# Altium footprint library 电阻封装库.PcbLib: 218 footprints (part 1 of 14)
Each footprint in its own frame and in the unit in brackets; x right, y up, seen from the top. Pads: shape width x height; smd on the part's side, far side on the other; paste and mask are expansions set on the pad; w line width, h text height; cw(c..) or ccw(c..) is an arc to the next point about the centre after c.
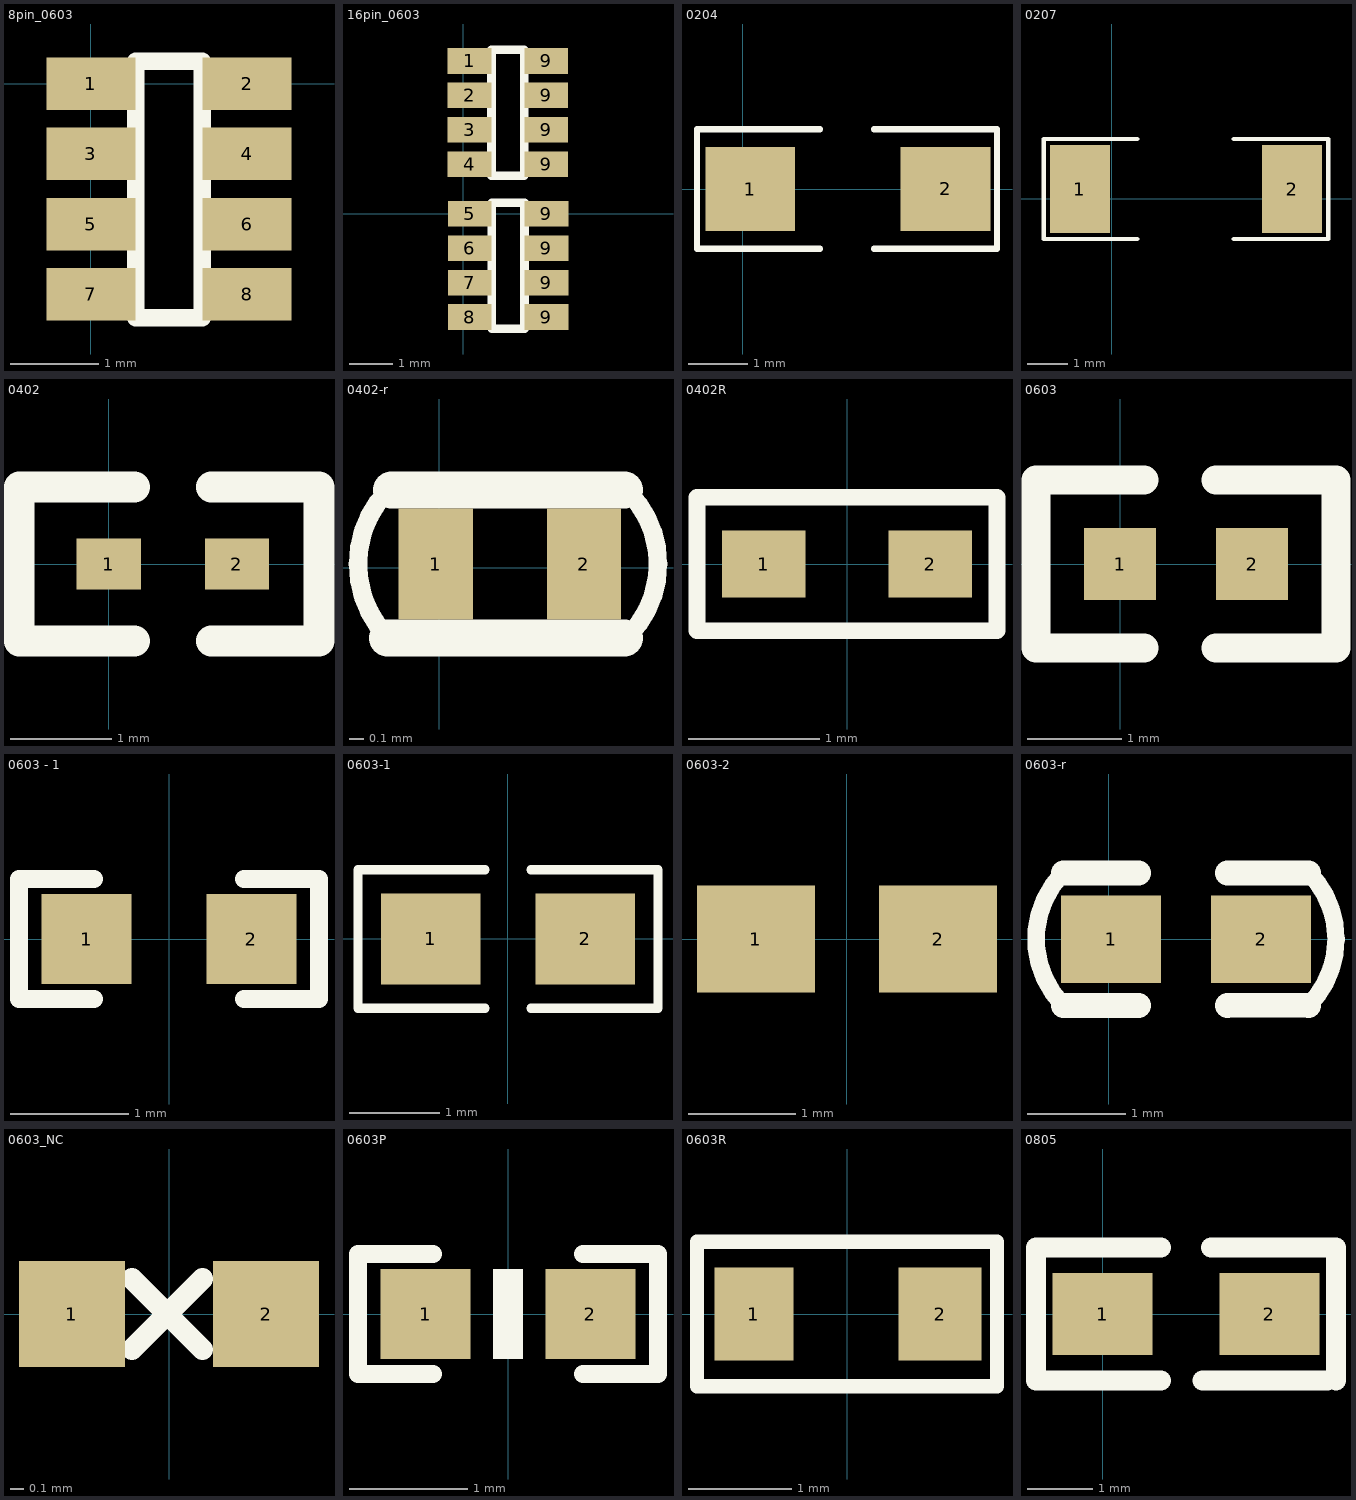
[diagram p0: the footprints below, top view; thin cyan lines are the x and y axes]

## 8pin_0603 [mm]
pads (8):
  rect 1.016x0.6 smd: 1(0,0) 2(1.778,0) 3(0,-0.8) 4(1.778,-0.8) 5(0,-1.6) 6(1.778,-1.6) 7(0,-2.4) 8(1.778,-2.4)
Top Overlay:
  lines w0.2: 0.508,-2.667 1.27,-2.667 1.27,0.254 0.508,0.254 0.508,-2.667

## 16pin_0603 [mm]
pads (16):
  rect 1.016x0.6 smd: 1(0.144,3.546) 2(0.144,2.746) 3(0.144,1.946) 4(0.144,1.146) 5(0.15,-0.005) 6(0.15,-0.805) 7(0.15,-1.605) 8(0.15,-2.405) 9(1.922,1.146) 9(1.922,1.946) 9(1.922,2.746) 9(1.922,3.546) 9(1.928,-2.405) 9(1.928,-1.605) 9(1.928,-0.805) 9(1.928,-0.005)
Top Overlay:
  lines w0.2: 0.652,0.879 1.414,0.879 1.414,3.8 0.652,3.8 0.652,0.879 ; 0.658,-2.672 0.658,0.249 1.42,0.249 1.42,-2.672 0.658,-2.672

## 0204 [mm]
height 0.6
pads (2):
  rect 1.5x1.4 smd: 1(0.127,0) 2(3.4,0)
Top Overlay:
  lines w0.102: 1.3,-1 -0.762,-1 -0.762,1 1.3,1 ; 2.2,-1 4.262,-1 4.262,1 2.2,1
3D body "Melf_0204.STEP": height 1.4, standoff 0, extent 0.078,-0.711 3.478,0.689

## 0207 [mm]
height 0.6
pads (2):
  rect 1.5x2.2 smd: 1(-0.796,0.246) 2(4.504,0.246)
Top Overlay:
  lines w0.102: 0.635,-1 -1.702,-1 -1.702,1.499 0.635,1.499 ; 3.048,-1 5.41,-1 5.41,1.499 3.048,1.499
3D body "R0207.STEP": height 2.2, standoff 0, extent -0.796,-0.854 4.504,1.346

## 0402 [mil]
pads (2):
  rect 25x20 smd: 1(0,0) 2(50,0)
Top Overlay:
  lines w12: 10,-30 -35,-30 -35,30 10,30 ; 40,-30 82,-30 82,30 40,30

## 0402-r [mil]
pads (2):
  rect 20x30 smd: 1(-1,1) 2(39,1)
Top Overlay:
  lines w5: -13.65,-19.15 cw(c6.5,1) -13.65,21.15 ; 50.95,-18.45 ccw(c31.5,1) 50.95,20.45
  lines w10: -14,-19 50,-19 ; -13,21 50,21
3D body "User Library-RES_1005-0402.STEP": height 16.14, standoff 0, extent -4.64,-10 40.64,11.65

## 0402R [mil]
pads (2):
  rect 25x20 smd: 1(-25,0) 2(25,0)
Top Overlay:
  lines w5: -45,-20 15,-20 45,-20 45,20 15,20 -45,20 -45,-20
Top Solder:
  lines w5: -20,20 0,20
3D body "User Library-RES_1005-0402.STEP": height 16.14, standoff 0, extent -22.64,-10.83 22.64,10.83

## 0603 [mil]
pads (2):
  rect 30x30 smd: 1(0,0) 2(55,0)
Top Overlay:
  lines w12: 10,-35 -35,-35 -35,35 10,35 ; 40,-35 90,-35 90,35 40,35

## 0603 - 1 [mil]
pads (2):
  rect 30x30 smd: 1(-27.5,0) 2(27.5,0)
Top Overlay:
  lines w6: -25,-20 -50,-20 -50,20 -25,20 ; 25,-20 50,-20 50,20 25,20

## 0603-1 [mm] "贴片带丝印"
height 0.6
pads (2):
  rect 1.1x1 smd: 1(-0.85,0) 2(0.85,0)
Top Overlay:
  lines w0.1: -0.254,-0.762 -1.651,-0.762 -1.651,0.762 -0.254,0.762 ; 0.254,-0.762 1.651,-0.762 1.651,0.762 0.254,0.762
3D body: height 1, standoff 0, extent -1.143,-0.381 1.143,0.381

## 0603-2 [mm] "贴片无丝印"
height 0.6
pads (2):
  rect 1.1x1 smd: 1(-0.85,0) 2(0.85,0)

## 0603-r [mil]
pads (2):
  rect 40x35 smd: 1(1,0) 2(61,0)
Top Overlay:
  lines w7: -18.02,-26.52 cw(c8.5,0) -18.02,26.52 ; 80.02,-26.52 ccw(c53.5,0) 80.02,26.52
  lines w10: -18.02,-26.5 11.98,-26.5 ; -18.02,26.5 11.98,26.5 ; 47.52,-26.52 80.02,-26.5 ; 47.52,26.5 80.02,26.5
3D body "User Library-RES_1609-0603.STEP": height 22.05, standoff 0, extent -3.46,-16 63.46,15.5

## 0603_NC [mil]
pads (2):
  rect 30x30 smd: 1(-27.5,0) 2(27.5,0)
Top Overlay:
  lines w6: -10.53,9.97 9.47,-10.03 ; -10.5,-10 9.47,9.97

## 0603P [mil]
pads (2):
  rect 30x30 smd: 1(-27.5,0) 2(27.5,0)
Top Overlay:
  region: 5,-15 5,15 -5,15 -5,-15
  lines w6: -25,-20 -50,-20 -50,20 -25,20 ; 25,-20 50,-20 50,20 25,20

## 0603R [mm]
pads (2):
  rect 0.762x0.9 smd: 1(-0.9,0)
  rect 0.8x0.9 smd: 2(0.9,0)
Top Overlay:
  lines w0.14: -1.45,-0.7 -1.45,0.7 1.45,0.7 1.45,-0.7 -1.45,-0.7
3D body "User Library-RES_1609-0603.STEP": height 0.56, standoff 0, extent -0.85,-0.4 0.85,0.4

## 0805 [mm]
pads (2):
  rect 1.524x1.25 smd: 1(0,0) 2(2.54,0)
Top Overlay:
  lines w0.305: 0.889,-1.016 -1.016,-1.016 -1.016,1.016 0.889,1.016 ; 1.524,-1.016 3.429,-1.016 ; 1.651,1.016 3.556,1.016 3.556,-1.016